# Altium footprint library connector.PcbLib: 138 footprints (part 2 of 9)
Each footprint in its own frame and in the unit in brackets; x right, y up, seen from the top. Pads: shape width x height; smd on the part's side, far side on the other; paste and mask are expansions set on the pad; w line width, h text height; cw(c..) or ccw(c..) is an arc to the next point about the centre after c.
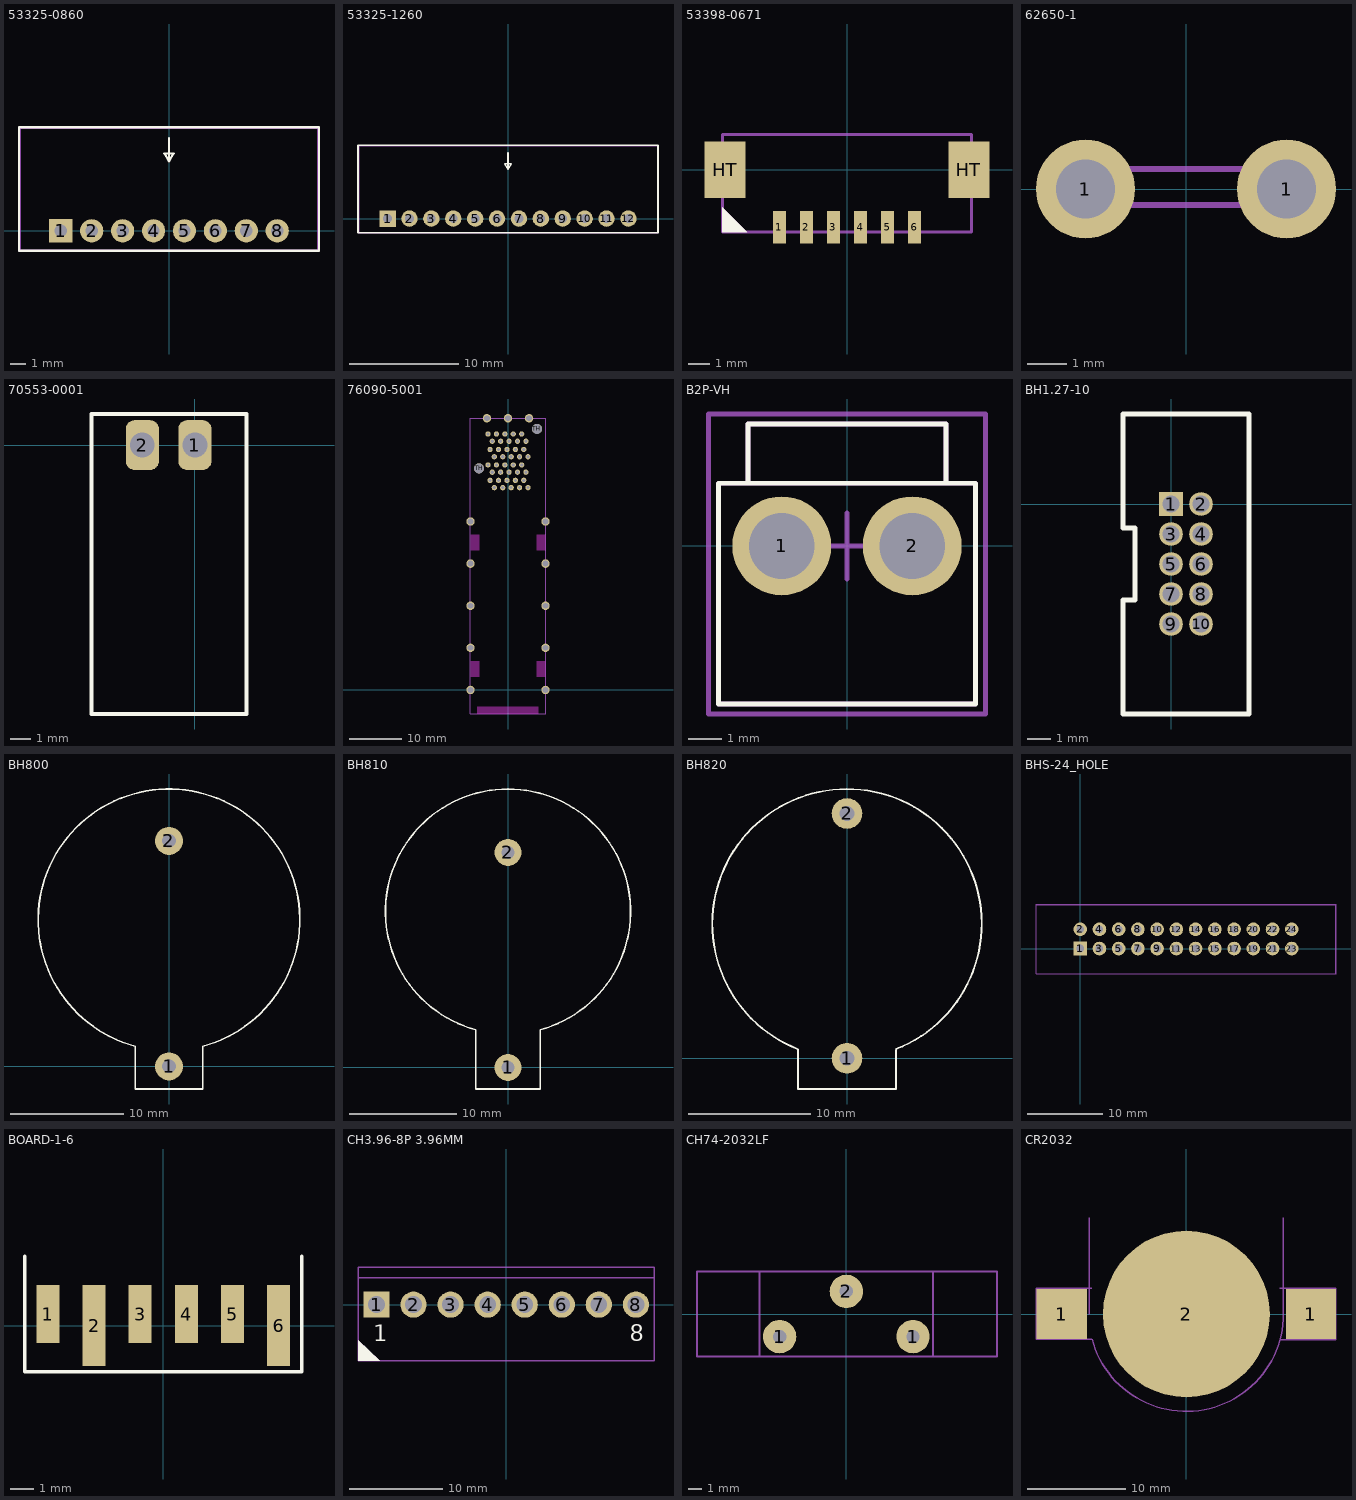
[diagram p1: the footprints below, top view; thin cyan lines are the x and y axes]

## 53325-0860 [mm]
height 5
pads (8):
  rect 1.5x1.5 hole 0.8: 1(-7,0)
  round 1.5 hole 0.8: 2(-5,0) 3(-3,0) 4(-1,0) 5(1,0) 6(3,0) 7(5,0) 8(7,0)
Top Overlay:
  lines w0.15: 0,6 0,4.5 ; 0,4.5 0.3,5 -0.3,5 0,4.5 ; -9.7,-1.3 9.7,-1.3 9.7,6.7 -9.7,6.7 -9.7,-1.3
Mechanical 29:
  lines w0.15: -9.65,-1.3 -9.65,6.65 9.65,6.65 9.65,-1.3 -9.65,-1.3
  text ".Designator" at -3,3.2 h1
3D body "533250860.stp": height 4.95, standoff -3.4, extent -9.65,-1.3 9.65,6.65

## 53325-1260 [mm]
height 5
pads (12):
  rect 1.5x1.5 hole 0.8: 1(-11,0)
  round 1.5 hole 0.8: 2(-9,0) 3(-7,0) 4(-5,0) 5(-3,0) 6(-1,0) 7(1,0) 8(3,0) 9(5,0) 10(7,0) 11(9,0) 12(11,0)
Top Overlay:
  lines w0.15: 0,6 0,4.5 ; 0,4.5 0.3,5 -0.3,5 0,4.5 ; -13.7,-1.3 13.7,-1.3 13.7,6.7 -13.7,6.7 -13.7,-1.3
Mechanical 29:
  lines w0.15: -13.65,-1.3 -13.65,6.65 13.7,6.65 13.7,-1.3 -13.65,-1.3
  text ".Designator" at -3.5,3.7 h1
3D body "533251260.stp": height 4.95, standoff -3.4, extent -13.65,-1.35 13.65,6.6

## 53398-0671 [mm] "Molex, LLC 0533980671, CONN HEADER 6POS 1.25MM VERT SMD"
height 4.8
pads (8):
  rect 0.6x1.5 smd: 1(-3.125,-2.65) 2(-1.875,-2.65) 3(-0.625,-2.65) 4(0.625,-2.65) 5(1.875,-2.65) 6(3.125,-2.65)
  rect 1.9x2.6 smd: HT(-5.625,0) HT(5.625,0)
Top Overlay:
  region: -5.75,-2.875 -5.75,-1.725 -4.6,-2.875
Mechanical 29:
  region: -5.75,-2.875 -5.75,-1.725 -4.6,-2.875
  lines w0.15: -5.75,-1.525 -5.75,-2.875 ; -3.6,-2.875 -5.75,-2.875 ; 3.6,-2.875 5.75,-2.875 ; 5.75,-1.525 5.75,-2.875 ; -5.75,-2.875 -5.75,1.625 ; -5.75,-2.875 5.75,-2.875 ; -5.75,1.625 5.75,1.625 ; -5.75,1.625 0,1.625 5.75,1.625 ; 5.75,-2.875 5.75,1.625
  text ".Designator" at -3.5,-0.3 h1
3D body "533980671.stp": height 4.7, standoff 0, extent -6.325,-2.75 6.325,1.45

## 62650-1 [mm]
height 10
pads (2):
  round 2.5 hole 1.5: 1(-2.54,0) 1(2.54,0)
Mechanical 29:
  lines w0.15: -3.5,-0.4 -3.5,0.5 3.5,0.5 3.5,-0.4 -3.5,-0.4
  text ".Designator" at -3,1.7 h1
3D body "62650-1.STEP": height 9.19, standoff -3.18, extent -3.555,-0.42 3.555,0.42

## 70553-0001 [mm] "Molex, 2.54mm Pitch SL™ Header, Low Profile, Single Row, Right Angle, 3.05mm Pocket, Shrouded, 2 Circuits, 0.38µm Gold (Au) Selective Plating, Tin (Sn) PC Tail Plating"
pads (2):
  rrect50% 1.6x2.4 hole 1.2: 1(0,0) 2(-2.54,0)
Top Overlay:
  lines w0.2: -5,-13 -5,1.5 2.5,1.5 2.5,-13 -5,-13
3D body "705530001.stp": height 6.98, standoff -3.3, extent -4.953,-12.89 2.413,0.699

## 76090-5001 [mm] "Small Form-factor Pluggable Plus (SFP+) Stacked 2-by-1 Multi-Port Connector with 4 Lightpipe Ports, Elastomeric Gasket, 40 Circuits, Tin (Sn) Tails"
height 26
pads (55):
  round 1 hole 0.6: L1(3.4,41.37) L2(2.6,42.75) L3(1.8,41.37) L4(1,42.75) L5(0.2,41.37) L6(-0.6,42.75) L7(-1.4,41.37) L8(-2.2,42.75) L9(-3,41.37) L10(-3.8,42.75) L11(-3.4,39.82) L12(-2.6,38.43) L13(-1.8,39.82) L14(-1,38.43) L15(-0.2,39.82) L16(0.6,38.43) L17(1.4,39.82) L18(2.2,38.43) L19(3,39.82) L20(3.8,38.43) T1(-3.4,45.69) T2(-2.6,44.3) T3(-1.8,45.69) T4(-1,44.3) T5(-0.2,45.69) T6(0.6,44.3) T7(1.4,45.69) T8(2.2,44.3) T9(3,45.69) T10(3.8,44.3) T11(3.4,47.24) T12(2.6,48.62) T13(1.8,47.24) T14(1,48.62) T15(0.2,47.24) T16(-0.6,48.62) T17(-1.4,47.24) T18(-2.2,48.62) T19(-3,47.24) T20(-3.8,48.62)
  round 1.6 hole 1.1: TH(-7.125,0) TH(-7.125,8) TH(-7.125,16) TH(-7.125,24) TH(-7.125,32) TH(-4,51.625) TH(0,51.625) TH(4,51.625) TH(7.125,0) TH(7.125,8) TH(7.125,16) TH(7.125,24) TH(7.125,32)
  round 1.9 hole 1.9: TH(-5.5,42.1) TH(5.5,49.6)
Keep-Out Layer:
  rectangle: -5.855,-4.572 5.829,-3.175
  rectangle: -7.125,2.5 -5.375,5.5
  rectangle: -7.125,26.5 -5.375,29.5
  region: 7.125,29.5 5.375,29.5 5.375,26.5 7.125,26.5
  region: 7.125,5.5 5.375,5.5 5.375,2.5 7.125,2.5
Mechanical 29:
  lines w0.15: -7.125,-4.5 7.125,-4.5 7.125,51.625 -7.125,51.625 -7.125,-4.5
  text ".Designator" at -3,25.7 h1
3D body "760905001.stp": height 28.15, standoff -3.32, extent -9.75,-11.5 9.75,51.75

## B2P-VH [mm]
height 11
pads (2):
  round 3 hole 2: 1(-1.98,0) 2(1.98,0)
Top Overlay:
  lines w0.15: -3,1.9 -3,3.7 3,3.7 3,1.9 ; -3.9,1.9 3.9,1.9 ; -3.9,1.9 -3.9,-4.8 3.9,-4.8 3.9,1.9 ; -3.9,1.9 3.9,1.9
Mechanical 15:
  lines w0.15: -1,0 1,0 ; 0,-1 0,1 ; -4.2,-5.1 4.2,-5.1 4.2,4 -4.2,4 -4.2,-5.1
Mechanical 29:
  lines w0.15: -3,1.9 -3,3.7 3,3.7 3,1.9 ; -3.9,1.9 3.9,1.9 ; -3.9,1.9 -3.9,-4.8 3.9,-4.8 3.9,1.9 ; -3.9,1.9 3.9,1.9
  text ".Designator" at -3,-1.8 h1
3D body "B2P-VH-BK.STEP": height 10.9, standoff -3.7, extent -3.93,-4.65 3.93,3.85

## BH1.27-10 [mm] "BH1.27-10"
pads (10):
  rect 1x1 hole 0.7: 1(0,0)
  round 1 hole 0.7: 2(1.27,0) 3(0,-1.27) 4(1.27,-1.27) 5(0,-2.54) 6(1.27,-2.54) 7(0,-3.81) 8(1.27,-3.81) 9(0,-5.08) 10(1.27,-5.08)
Top Overlay:
  lines w0.2: -2.032,-8.89 3.302,-8.89 3.302,3.81 -2.032,3.81 -2.032,-1.016 -1.524,-1.016 -1.524,-4.064 -2.032,-4.064 -2.032,-8.89
3D body "CONB127P-2R-10W_TH.STEP": height 5.4, standoff -2.1, extent -2.015,-8.865 3.185,3.785

## BH800 [mm]
height 6.6
pads (2):
  round 2.5 hole 1.2: 1(0,0) 2(0,20)
Top Overlay:
  lines w0.15: -3.001,1.795 cw(c0,13) 3.001,1.795 ; -3,1.8 -3,-2 3,-2 3,1.8
3D body: height 8.2, standoff 0, extent -3,-2 3,3.5
3D body: height 8.2, standoff 0, extent -11.6,1.403 11.6,24.597

## BH810 [mm]
height 6.6
pads (2):
  round 2.5 hole 1.2: 1(0,0) 2(0,20)
Top Overlay:
  lines w0.15: -3,3.5 -3,-2 3,-2 3,3.5 ; -3,3.502 cw(c0,14.5) 3,3.502
3D body: height 6.6, standoff 0, extent -3,-2 3,3.5
3D body: height 6.6, standoff 0, extent -11.4,3.103 11.4,25.897

## BH820 [mm]
height 6.6
pads (2):
  round 2.5 hole 1.2: 1(0,0) 2(0,20)
Top Overlay:
  lines w0.15: -4,0.7 -4,-2.5 4,-2.5 4,0.7 ; -3.982,0.746 cw(c0,11) 4.016,0.759
3D body: height 8.5, standoff 0, extent -4,-2.5 4,0.7
3D body: height 8.5, standoff 0, extent -11.4,-0.897 11.4,21.897

## BHS-24_HOLE [mm]
pads (24):
  rect 1.8x1.8 hole 1: 1(0,0)
  round 1.8 hole 1: 2(0,2.54) 3(2.54,0) 4(2.54,2.54) 5(5.08,0) 6(5.08,2.54) 7(7.62,0) 8(7.62,2.54) 9(10.16,0) 10(10.16,2.54) 11(12.7,0) 12(12.7,2.54) 13(15.24,0) 14(15.24,2.54) 15(17.78,0) 16(17.78,2.54) 17(20.32,0) 18(20.32,2.54) 19(22.86,0) 20(22.86,2.54) 21(25.4,0) 22(25.4,2.54) 23(27.94,0) 24(27.94,2.54)
Mechanical 29:
  circle w0.15: c0,0 r0.554
  lines w0.15: -5.842,-3.302 -5.842,5.842 33.782,5.842 33.782,-3.302 -5.842,-3.302 ; -5.8,-3.325 33.725,-3.325 33.725,5.8 -5.8,5.8 -5.8,-3.325
  text ".Designator" at 10.5,0.7 h1
3D body "IDC-24MS.STEP": height 9.1, standoff -3, extent -4.99,-3.275 33.09,6.325

## BOARD-1-6 [mm]
pads (6):
  rect 1x2.5 smd: 1(-5,0.5) 3(-1,0.5) 4(1,0.5) 5(3,0.5)
  rect 1x3.5 smd: 2(-3,0) 6(5,0)
Top Overlay:
  lines w0.15: -6,3 -6,-2 6,-2 6,3

## CH3.96-8P 3.96MM [mm]
height 22
pads (8):
  rect 2.8x2.8 hole 1.8: 1(-13.86,0)
  round 2.8 hole 1.8: 2(-9.9,0) 3(-5.94,0) 4(-1.98,0) 5(1.98,0) 6(5.94,0) 7(9.9,0) 8(13.86,0)
Top Overlay:
  region: -15.84,-3.825 -15.84,-6 -13.525,-6
  text "1" at -14.225,-4.5 h3
  text "8" at 13.225,-4.5 h3
Mechanical 29:
  region: -15.84,-3.825 -15.84,-6 -13.525,-6
  lines w0.15: -15.84,-6 -15.84,4 ; -15.84,-6 0,-6 ; -15.84,-6 -15.84,4 ; -15.84,-6 0,-6 ; -15.84,4 0,4 ; -15.84,4 0,4 ; 0,-6 15.84,-6 ; 0,-6 15.84,-6 ; 0,4 15.84,4 ; 0,4 15.84,4 ; 15.84,-6 15.84,4 ; 15.84,-6 15.84,4 ; -15.84,2.875 15.875,2.875 -15.84,2.875
  text ".Designator" at -4,-1.8 h1
3D body "CH3.96-8P 3.96MM.STEP": height 13.5, standoff -4, extent -15.84,-6 15.84,4

## CH74-2032LF [mm]
height 18.1
pads (3):
  round 2.5 hole 1: 1(-5,-1.7) 1(5,-1.7) 2(0,1.7)
Mechanical 29:
  lines w0.15: -6.5,-3.2 -6.5,3.2 ; -6.5,-3.2 6.5,-3.2 ; -6.5,-3.2 6.5,-3.2 ; -6.5,-3.2 -6.5,3.2 ; -6.5,-3.2 -11.2,-3.2 -11.2,3.2 -6.5,3.2 ; -6.5,3.2 6.5,3.2 ; -6.5,3.2 6.5,3.2 ; 6.5,-3.2 6.5,3.2 ; 6.5,-3.2 6.5,3.2 ; 6.5,-3.2 11.3,-3.2 11.3,0 11.3,3.2 6.5,3.2
  text ".Designator" at -3.5,-0.3 h1
3D body "User Library-Battery holder CR 2032.step": height 18.2, standoff -2.9, extent -11.224,-3.225 11.275,3.175

## CR2032 [mm]
pads (3):
  rect 5.1x5.1 smd: 1(-12.7,0) 1(12.7,0)
  round 17 smd paste-16: 2(0,0)
Mechanical 29:
  lines w0.15: -9.9,0 -9.9,9.8 ; -9.65,-2.575 -15.325,-2.575 -15.325,2.625 -9.625,2.625 ; -9.613,-2.557 ccw(c-0.025,0) 9.898,0 9.898,9.8 ; 9.525,2.6 15.225,2.6 15.225,-2.6 9.55,-2.6 9.55,-2.675
  text ".Designator" at -3.5,-0.3 h1
3D body "Battery CR2032.stp": height 3.17, standoff -0.01, extent -10.107,-9.988 9.829,9.988
3D body "battery_holder.stp": height 3.96, standoff 0, extent -15.334,-10.3 15.4,9.753